# Altium footprint library base.PcbLib: 116 footprints (part 7 of 8)
Each footprint in its own frame and in the unit in brackets; x right, y up, seen from the top. Pads: shape width x height; smd on the part's side, far side on the other; paste and mask are expansions set on the pad; w line width, h text height; cw(c..) or ccw(c..) is an arc to the next point about the centre after c.
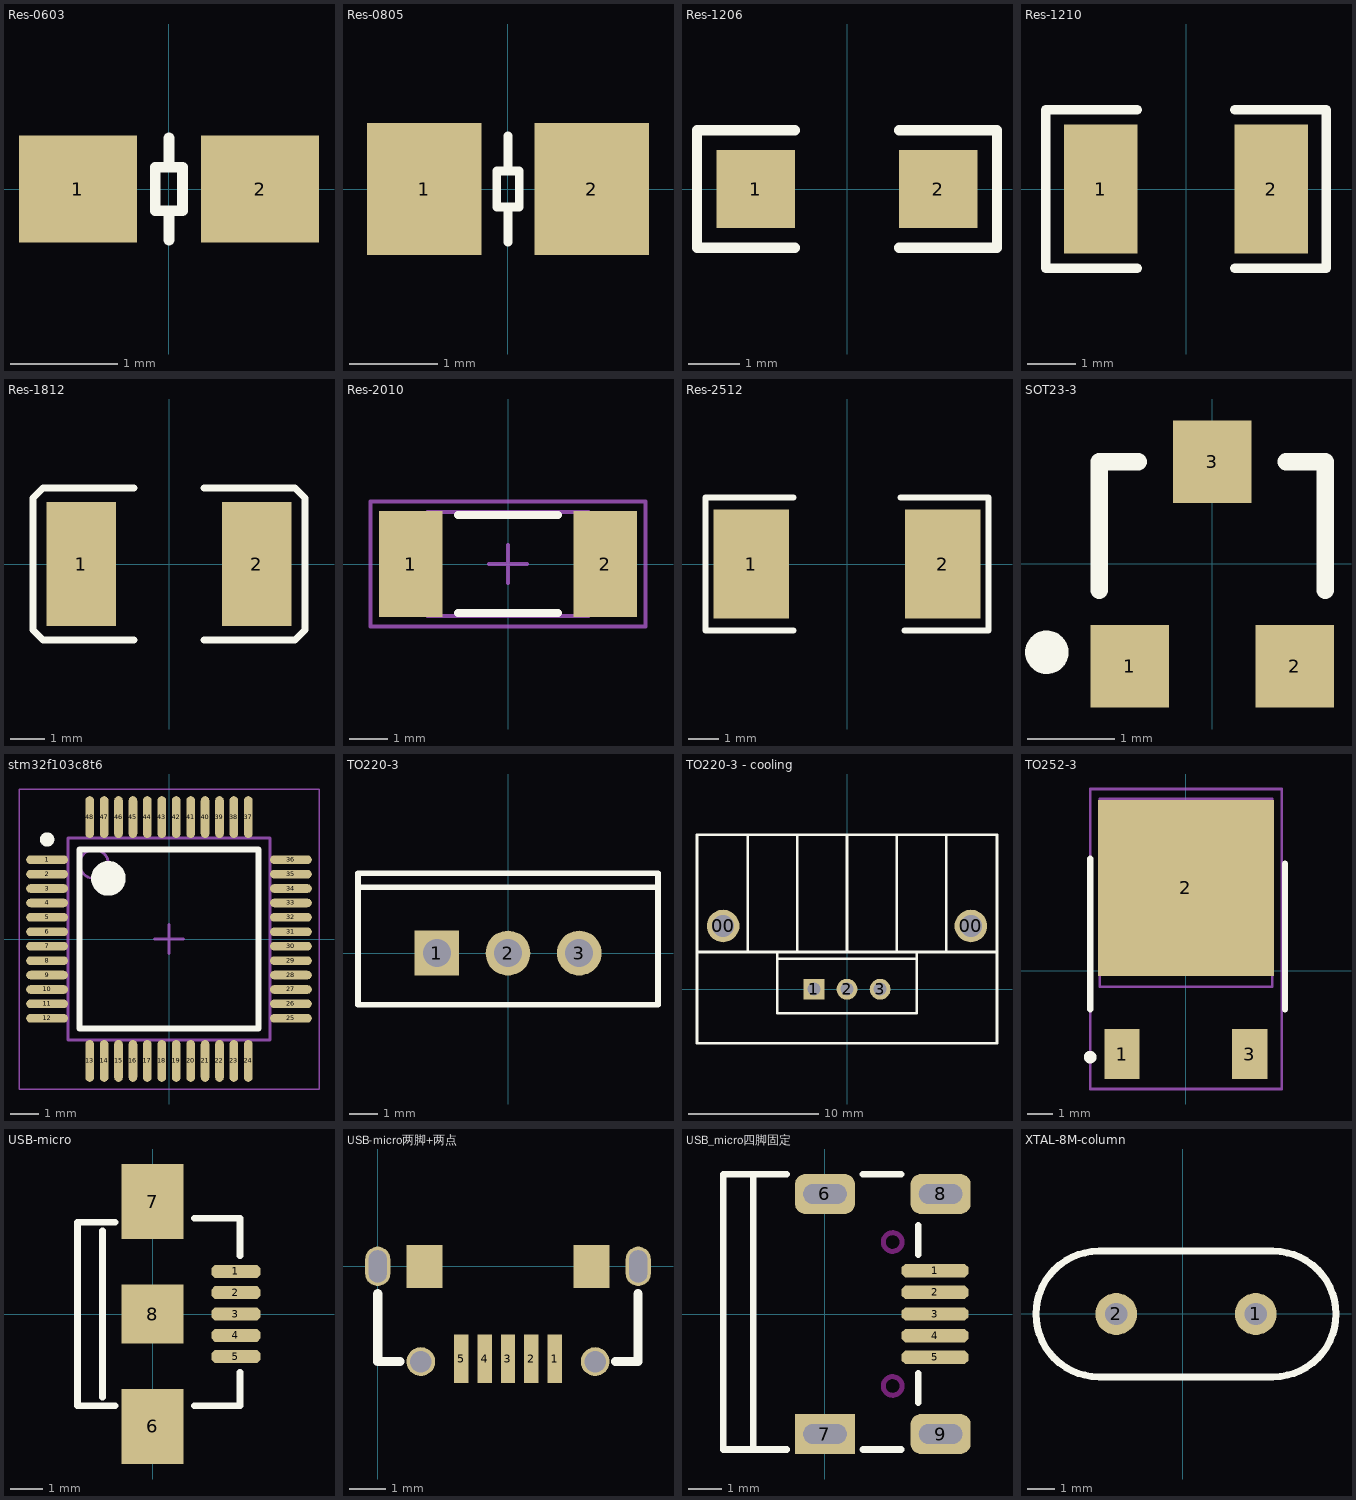
[diagram p6: the footprints below, top view; thin cyan lines are the x and y axes]

## Res-0603 [mm]
height 0.6
pads (2):
  rect 1.1x1 smd: 1(-0.85,0) 2(0.85,0)
Top Overlay:
  lines w0.1: 0,-0.476 0,-0.203 ; 0,0.203 0,0.476 ; -0.127,-0.203 -0.127,0.203 0.127,0.203 0.127,-0.203 -0.127,-0.203
3D body "RESC1608(0603).STEP": height 0.38, standoff 0, extent -0.8,-0.4 0.8,0.4

## Res-0805 [mm]
height 1.1
pads (2):
  rect 1.3x1.5 smd: 1(-0.95,0) 2(0.95,0)
Top Overlay:
  lines w0.1: 0,-0.6 0,-0.203 ; 0,0.203 0,0.6 ; -0.127,-0.203 0.127,-0.203 0.127,0.203 -0.127,0.203 -0.127,-0.203
3D body "RESC2012(0805).STEP": height 0.5, standoff 0, extent -1,-0.6 1,0.6

## Res-1206 [mil]
height 59.06
pads (2):
  rect 60x60 smd: 1(-70,0) 2(70,0)
Top Overlay:
  lines w7.87: -40,-45 -115,-45 -115,45 -40,45 ; 40,-45 115,-45 115,45 40,45
3D body "RESC3216(1206).STEP": height 23.62, standoff 0, extent -62.99,-31.49 63,31.5

## Res-1210 [mil]
height 59.06
pads (2):
  rect 60x106.3 smd: 1(-70,0) 2(70,0)
Top Overlay:
  lines w7.87: -40,-65 -115,-65 -115,65 -40,65 ; 40,-65 115,-65 115,65 40,65
3D body "RESC3225(1210).STEP": height 23.62, standoff 0, extent -62.99,-49.21 63,49.22

## Res-1812 [mm]
height 1
pads (2):
  rect 2x3.6 smd: 1(-2.54,0) 2(2.54,0)
Top Overlay:
  lines w0.2: -1.016,-2.2 -3.642,-2.2 -3.937,-1.905 -3.937,1.905 -3.642,2.2 -1.016,2.2 ; 1.016,-2.2 3.642,-2.2 3.937,-1.905 3.937,1.905 3.642,2.2 1.016,2.2
3D body "RESC4532(1812).STEP": height 0.7, standoff 0, extent -2.25,-1.6 2.25,1.6

## Res-2010 [mm]
height 0.6
pads (2):
  rect 1.65x2.75 smd: 1(-2.525,0) 2(2.525,0)
Top Overlay:
  lines w0.2: -1.3,-1.275 1.3,-1.275 ; -1.3,1.275 1.3,1.275
Mechanical 13:
  lines w0.1: -2.1,-1.35 2.1,-1.35 2.1,1.35 -2.1,1.35 -2.1,-1.35
Mechanical 15:
  lines w0.1: -0.5,0 0.5,0 ; 0,-0.5 0,0.5 ; -3.575,-1.625 3.575,-1.625 3.575,1.625 -3.575,1.625 -3.575,-1.625
3D body "RESC5025(2010).STEP": height 0.65, standoff 0, extent -2.5,-1.25 2.5,1.25

## Res-2512 [mm]
height 1
pads (2):
  rect 2.5x3.6 smd: 1(-3.175,0) 2(3.175,0)
Top Overlay:
  lines w0.2: -1.778,-2.2 -4.699,-2.2 -4.699,2.2 -1.778,2.2 ; 1.778,2.2 4.699,2.2 4.699,-2.2 1.905,-2.2
3D body "RESC6432(2512).STEP": height 0.7, standoff 0, extent -3.2,-1.6 3.2,1.6

## SOT23-3 [mm]
height 1.1
pads (3):
  rect 0.9x0.95 smd: 1(-0.95,-1.175) 2(0.95,-1.175) 3(0,1.175)
Top Overlay:
  circle w0.25: c-1.903,-1.016 r0.125
  lines w0.2: -1.3,-0.3 -1.3,1.175 -0.85,1.175 ; 0.85,1.175 1.3,1.175 1.3,-0.3
3D body "SOT23-3.STEP": height 1.2, standoff 0, extent -1.45,-1.4 1.45,1.4

## stm32f103c8t6 [mm] "QFP, 100-Leads, Body 14.00x20.00mm, Pitch 0.65mm, IPC Medium Density"
height 2.45
pads (48):
  oval 1.45x0.3 smd: 1(-4.225,2.75) 2(-4.225,2.25) 3(-4.225,1.75) 4(-4.225,1.25) 5(-4.225,0.75) 6(-4.225,0.25) 7(-4.225,-0.25) 8(-4.225,-0.75) 9(-4.225,-1.25) 10(-4.225,-1.75) 11(-4.225,-2.25) 12(-4.225,-2.75) 25(4.225,-2.75) 26(4.225,-2.25) 27(4.225,-1.75) 28(4.225,-1.25) 29(4.225,-0.75) 30(4.225,-0.25) 31(4.225,0.25) 32(4.225,0.75) 33(4.225,1.25) 34(4.225,1.75) 35(4.225,2.25) 36(4.225,2.75)
  oval 0.3x1.45 smd: 13(-2.75,-4.225) 14(-2.25,-4.225) 15(-1.75,-4.225) 16(-1.25,-4.225) 17(-0.75,-4.225) 18(-0.25,-4.225) 19(0.25,-4.225) 20(0.75,-4.225) 21(1.25,-4.225) 22(1.75,-4.225) 23(2.25,-4.225) 24(2.75,-4.225) 37(2.75,4.225) 38(2.25,4.225) 39(1.75,4.225) 40(1.25,4.225) 41(0.75,4.225) 42(0.25,4.225) 43(-0.25,4.225) 44(-0.75,4.225) 45(-1.25,4.225) 46(-1.75,4.225) 47(-2.25,4.225) 48(-2.75,4.225)
Top Overlay:
  circle w0.6: c-2.1,2.1 r0.3
  circle w0.25: c-4.225,3.45 r0.125
  lines w0.2: -3.1,-3.1 3.1,-3.1 3.1,3.1 -3.1,3.1 -3.1,-3.1
Mechanical 13:
  circle w0.1: c-2.6,2.6 r0.5
  lines w0.1: -3.5,-3.5 3.5,-3.5 3.5,3.5 -3.5,3.5 -3.5,-3.5
Mechanical 15:
  lines w0.05: -5.2,-5.2 5.2,-5.2 5.2,5.2 -5.2,5.2 -5.2,-5.2
  lines w0.1: -0.5,0 0.5,0 ; 0,-0.5 0,0.5
3D body "LQFP50P900X900X160.STEP": height 1.6, standoff 0, extent -4.5,-4.5 4.5,4.5

## TO220-3 [mm] "TO, Thru-Hole, Vertical, Heatsink Mounted; 3 In-Line Leads; Pitch 2.54 mm"
height 19.4
pads (3):
  rect 1.6x1.6 hole 1: 1(-2.54,0)
  round 1.6 hole 1: 2(0,0) 3(2.54,0)
Top Overlay:
  lines w0.2: -5.35,2.35 5.35,2.35 ; -5.35,-1.85 5.35,-1.85 5.35,2.85 -5.35,2.85 -5.35,-1.85
3D body "User Library-Transistors TO-220 3L.STEP": height 18.6, standoff -9.87, extent -5.08,-1.651 5.08,2.7

## TO220-3 - cooling [mm]
height 19.4
pads (5):
  round 2.5 hole 1.7: 00(-9.5,4.85) 00(9.5,4.85)
  rect 1.6x1.6 hole 1: 1(-2.54,0)
  round 1.6 hole 1: 2(0,0) 3(2.54,0)
Top Overlay:
  lines w0.2: -11.5,2.85 11.5,2.85 ; -7.62,2.85 -7.62,11.85 ; -5.35,2.35 5.35,2.35 ; -3.81,2.85 -3.81,11.74 ; 0,2.85 0,11.85 ; 3.81,2.85 3.81,11.85 ; 7.62,2.85 7.62,11.85 ; -11.5,-4.15 11.5,-4.15 11.5,11.85 -11.5,11.85 -11.5,-4.15 ; -5.35,-1.85 5.35,-1.85 5.35,2.85 -5.35,2.85 -5.35,-1.85
3D body "User Library-Transistors TO-220 3L.STEP": height 18.6, standoff -9.87, extent -5.08,-1.651 5.08,2.7

## TO252-3 [mm] "D2-PAK"
height 4.69
pads (3):
  rect 1.4x2 smd: 1(-2.54,-3.302) 3(2.54,-3.302)
  rect 7x7 smd: 2(0,3.302)
Top Overlay:
  circle w0.25: c-3.81,-3.427 r0.125
  lines w0.254: -3.81,-1.524 -3.81,4.467 ; 3.937,-1.524 3.937,4.267
Mechanical 13:
  lines w0.1: -3.429,-0.635 3.429,-0.635 3.429,6.858 -3.429,6.858 -3.429,-0.635
Mechanical 15:
  lines w0.1: -0.5,3.556 0.5,3.556 ; 0,3.056 0,4.056 ; -3.81,-4.694 3.81,-4.694 3.81,7.239 -3.81,7.239 -3.81,-4.694
3D body "User Library-DPAK-1.STEP": height 2.39, standoff -0.02, extent -3.27,-3.81 3.27,6.128

## USB-micro [mm]
pads (8):
  oct 1.5x0.4 smd: 1(2.54,1.3) 2(2.54,0.65) 3(2.54,0) 4(2.54,-0.65) 5(2.54,-1.3)
  rect 1.9x2.286 smd: 6(0,-3.429) 7(0,3.429)
  rect 1.9x1.8 smd: 8(0,0)
Top Overlay:
  lines w0.2: -1.524,-2.54 -1.524,2.54 ; -1.143,-2.794 -2.286,-2.794 -2.286,2.794 -1.143,2.794 ; 1.27,-2.794 2.667,-2.794 2.667,-1.778 ; 1.27,2.921 2.667,2.921 2.667,1.778

## USB-micro两脚+两点 [mm]
pads (11):
  rect 0.4x1.35 smd: 1(4.925,-2.575) 2(4.275,-2.575) 3(3.625,-2.575) 4(2.975,-2.575) 5(2.325,-2.575)
  oval 0.7x1.1 hole 0.5 slot 0.9 at 90 deg: ""(0,0) ""(7.25,0)
  round 0.8 hole 0.6: ""(1.2,-2.65) ""(6.05,-2.65)
  rect 1x1.2 smd: ""(1.3,0) ""(5.95,0)
Top Overlay:
  lines w0.254: 0,-0.762 0,-2.65 0.618,-2.65 ; 6.621,-2.65 7.239,-2.65 7.239,-0.762

## USB_micro四脚固定 [mm]
pads (9):
  oct 2x0.4 smd: 1(3.302,1.3) 2(3.302,0.65) 3(3.302,0) 4(3.302,-0.65) 5(3.302,-1.3)
  rrect50% 1.8x1.2 hole 0.6 slot 1.3 at 0 deg: 6(0,3.6) 8(3.47,3.6) 9(3.47,-3.6)
  rect 1.8x1.2 hole 0.6 slot 1.3 at 0 deg: 7(0,-3.6)
Top Overlay:
  lines w0.2: -1.143,-4.064 -2.15,-4.064 ; -1.143,4.191 -2.15,4.191 ; 1.143,-4.064 2.286,-4.064 ; 1.143,4.191 2.286,4.191 ; 2.794,-2.667 2.794,-1.778 ; 2.794,1.778 2.794,2.667 ; -2.15,-4.064 -3.048,-4.064 -3.048,-2.794 -3.048,2.794 -3.048,4.191 -2.15,4.191 ; -2.15,-4.064 -2.15,4.191
Keep-Out Layer:
  circle w0.15: c2.032,-2.159 r0.28
  circle w0.15: c2.032,2.159 r0.28

## XTAL-8M-column [mil] "直插式8M晶振"
pads (2):
  round 60 hole 32: 1(105,0) 2(-95,0)
Top Overlay:
  lines w10: -120,-90 cw(c-120,0) -120,90 130,90 cw(c130,0) 130,-90 -120,-90
3D body "XTAL 9mm.STEP": height 121.8, standoff -100, extent -205,-60 215,60